# Altium footprint library TarabusLib_KAP.PcbLib: 504 footprints (part 15 of 32)
Each footprint in its own frame and in the unit in brackets; x right, y up, seen from the top. Pads: shape width x height; smd on the part's side, far side on the other; paste and mask are expansions set on the pad; w line width, h text height; cw(c..) or ccw(c..) is an arc to the next point about the centre after c.
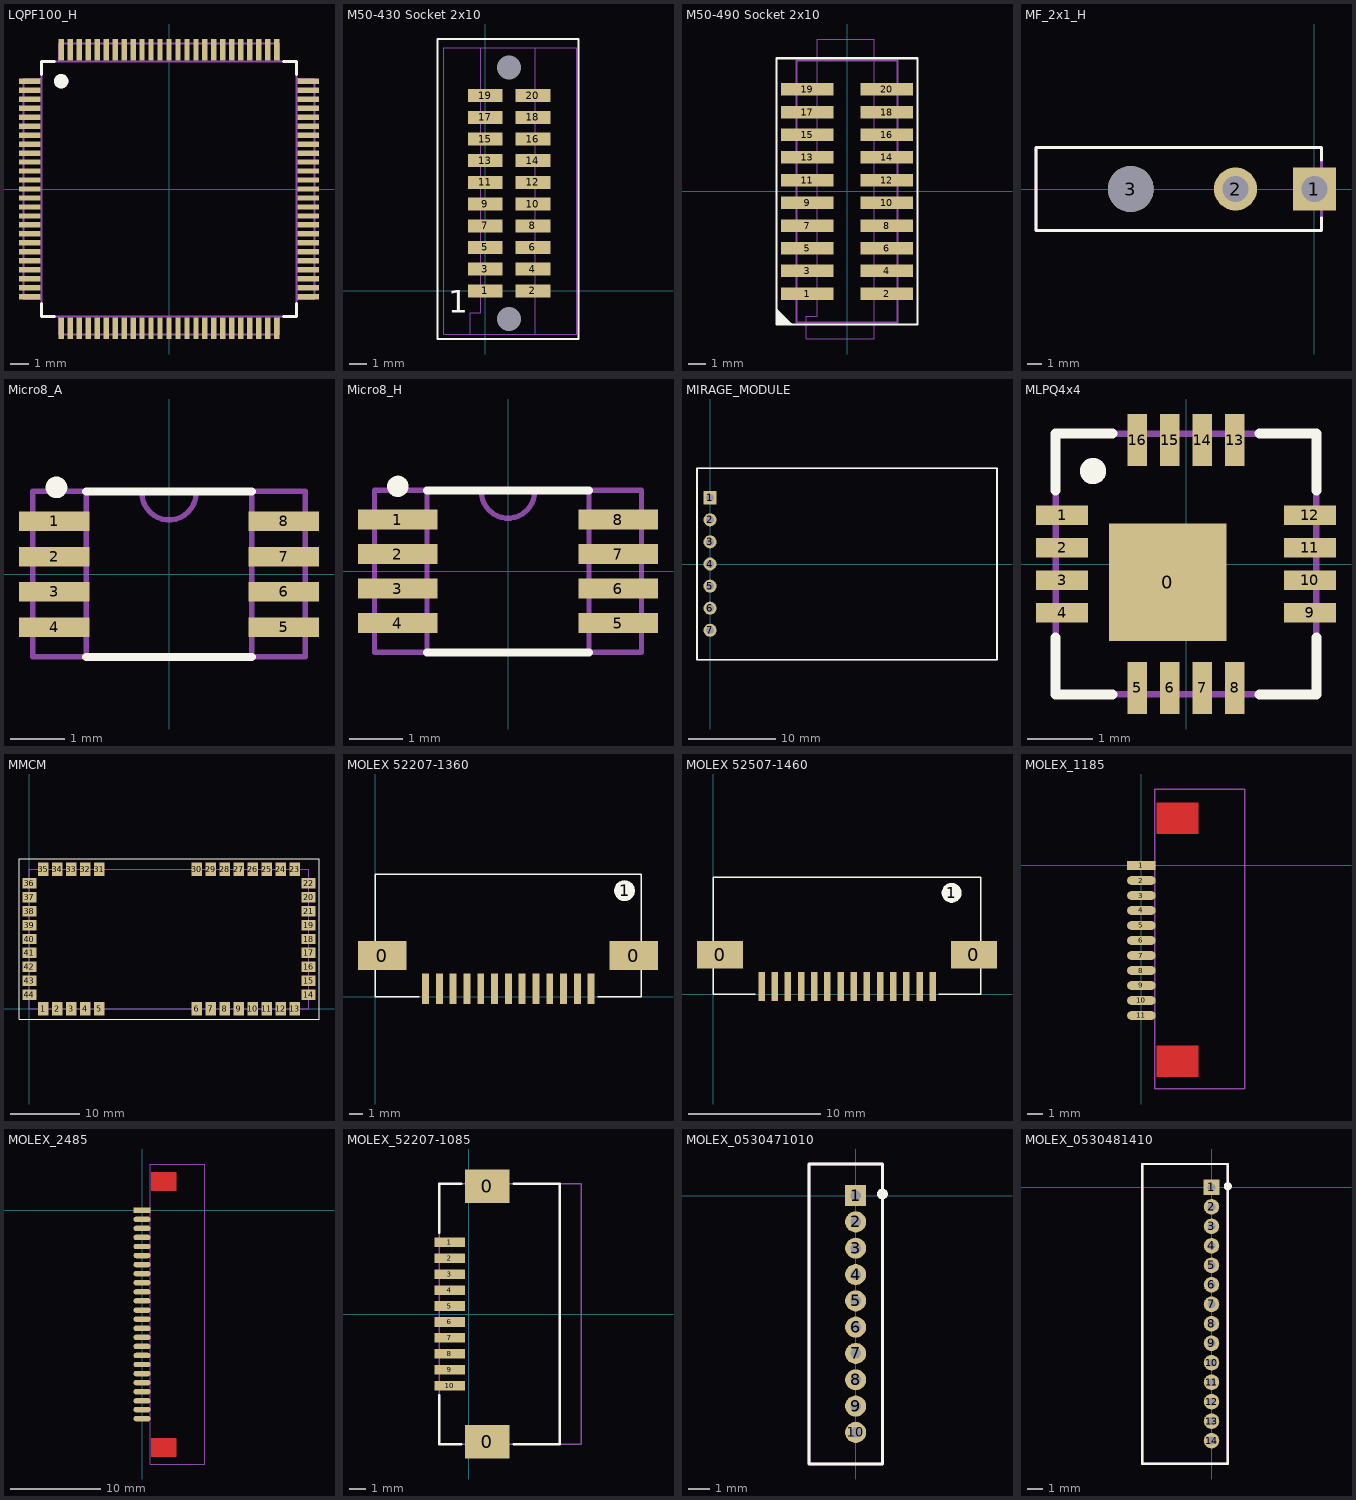
[diagram p14: the footprints below, top view; thin cyan lines are the x and y axes]

## LQPF100_H [mm]
height 1.6
pads (100):
  rect 1.2x0.3 smd: 1(-7.75,6) 2(-7.75,5.5) 3(-7.75,5) 4(-7.75,4.5) 5(-7.75,4) 6(-7.75,3.5) 7(-7.75,3) 8(-7.75,2.5) 9(-7.75,2) 10(-7.75,1.5) 11(-7.75,1) 12(-7.75,0.5) 13(-7.75,0) 14(-7.75,-0.5) 15(-7.75,-1) 16(-7.75,-1.5) 17(-7.75,-2) 18(-7.75,-2.5) 19(-7.75,-3) 20(-7.75,-3.5) 21(-7.75,-4) 22(-7.75,-4.5) 23(-7.75,-5) 24(-7.75,-5.5) 25(-7.75,-6) 51(7.75,-6) 52(7.75,-5.5) 53(7.75,-5) 54(7.75,-4.5) 55(7.75,-4) 56(7.75,-3.5) 57(7.75,-3) 58(7.75,-2.5) 59(7.75,-2) 60(7.75,-1.5) 61(7.75,-1) 62(7.75,-0.5) 63(7.75,0) 64(7.75,0.5) 65(7.75,1) 66(7.75,1.5) 67(7.75,2) 68(7.75,2.5) 69(7.75,3) 70(7.75,3.5) 71(7.75,4) 72(7.75,4.5) 73(7.75,5) 74(7.75,5.5) 75(7.75,6)
  rect 0.3x1.2 smd: 26(-6,-7.75) 27(-5.5,-7.75) 28(-5,-7.75) 29(-4.5,-7.75) 30(-4,-7.75) 31(-3.5,-7.75) 32(-3,-7.75) 33(-2.5,-7.75) 34(-2,-7.75) 35(-1.5,-7.75) 36(-1,-7.75) 37(-0.5,-7.75) 38(0,-7.75) 39(0.5,-7.75) 40(1,-7.75) 41(1.5,-7.75) 42(2,-7.75) 43(2.5,-7.75) 44(3,-7.75) 45(3.5,-7.75) 46(4,-7.75) 47(4.5,-7.75) 48(5,-7.75) 49(5.5,-7.75) 50(6,-7.75) 76(6,7.75) 77(5.5,7.75) 78(5,7.75) 79(4.5,7.75) 80(4,7.75) 81(3.5,7.75) 82(3,7.75) 83(2.5,7.75) 84(2,7.75) 85(1.5,7.75) 86(1,7.75) 87(0.5,7.75) 88(0,7.75) 89(-0.5,7.75) 90(-1,7.75) 91(-1.5,7.75) 92(-2,7.75) 93(-2.5,7.75) 94(-3,7.75) 95(-3.5,7.75) 96(-4,7.75) 97(-4.5,7.75) 98(-5,7.75) 99(-5.5,7.75) 100(-6,7.75)
Top Overlay:
  circle w0.4: c-6,6 r0.2
  lines w0.15: -7.1,-6.375 -7.1,-7.1 -6.375,-7.1 ; -7.1,6.375 -7.1,7.1 -6.375,7.1 ; 6.375,-7.1 7.1,-7.1 7.1,-6.375 ; 6.375,7.1 7.1,7.1 7.1,6.375
Mechanical 7:
  circle w0.4: c-6,6 r0.2
  lines w0.1: -7.1,-6.135 -8.1,-6.135 -8.1,6.135 -7.1,6.135 ; -6.135,-7.1 -6.135,-8.1 6.135,-8.1 6.135,-7.1 ; -6.135,7.1 -6.135,8.1 6.135,8.1 6.135,7.1 ; 7.1,-6.135 8.1,-6.135 8.1,6.135 7.1,6.135 ; -7.1,-7.1 -7.1,7.1 7.1,7.1 7.1,-7.1 -7.1,-7.1
Mechanical 10:
  text ".Comment" at -1.08,-0.495 h0.6
  text ".Designator" at -1.2,0.155 h0.8
3D body: height 1.6, standoff 0, extent -7.1,-7.1 7.1,7.1
3D body: height 0.9, standoff 0, extent -6.135,7.1 6.135,8.1
3D body: height 0.9, standoff 0, extent -8.1,-6.135 -7.1,6.135
3D body: height 0.9, standoff 0, extent 7.1,-6.135 8.1,6.135
3D body: height 0.9, standoff 0, extent -6.135,-8.1 6.135,-7.1

## M50-430 Socket 2x10 [mil]
height 240.16
pads (22):
  rect 80x30 smd paste-2 mask+4: 1(0,0) 2(110,0) 3(0,50) 4(110,50) 5(0,100) 6(110,100) 7(0,150) 8(110,150) 9(0,200) 10(110,200) 11(0,250) 12(110,250) 13(0,300) 14(110,300) 15(0,350) 16(110,350) 17(0,400) 18(110,400) 19(0,450) 20(110,450)
  round 5 / inner round 0 / far side round 5 hole 55 paste+0 mask+55: 21(55,-65) 22(54.96,515)
Top Overlay:
  lines w5: -110,-111 215,-111 215,580.51 -110,580.51 -110,-111
  text "1" at -85,-50 h52.5
Mechanical 1:
  lines w2: -35,-100 -35,-50 -10,-50 -10,560.83 115,560.83 115,-100 -35,-100
Mechanical 2:
  lines w0.1: -95.5,-100 210.5,-100 210.5,560.83 -95.5,560.83 -95.5,-100

## M50-490 Socket 2x10 [mm]
height 6.1
pads (20):
  rect 2.95x0.7 smd paste-0.051 mask+0.102: 1(-2.222,-5.715) 2(2.222,-5.715) 3(-2.222,-4.445) 4(2.222,-4.445) 5(-2.222,-3.175) 6(2.222,-3.175) 7(-2.222,-1.905) 8(2.222,-1.905) 9(-2.222,-0.635) 10(2.222,-0.635) 11(-2.222,0.635) 12(2.222,0.635) 13(-2.222,1.905) 14(2.222,1.905) 15(-2.222,3.175) 16(2.222,3.175) 17(-2.222,4.445) 18(2.222,4.445) 19(-2.222,5.715) 20(2.222,5.715)
Top Overlay:
  lines w0.127: -3.95,-7.237 -3.744,-7.444 ; -3.95,7.425 -3.95,-7.45 3.95,-7.45 3.95,7.425 ; -3.95,7.45 3.95,7.45 ; -3.937,-7.087 -3.612,-7.412 ; -3.937,-6.937 -3.437,-7.437 ; -3.937,-6.762 -3.3,-7.4 ; -3.937,-6.612 -3.119,-7.431
Mechanical 1:
  lines w0.051: -2.286,-8.255 1.524,-8.255 1.524,8.53 -1.651,8.53 -1.651,-6.985 -2.286,-6.985 -2.286,-8.255
Mechanical 7:
  lines w0.1: -2.825,-7.325 2.825,-7.325 2.825,7.325 -2.825,7.325 -2.825,-7.325
Mechanical 9:
  lines w0.1: -2.825,-7.325 -2.825,7.325 2.825,7.325 2.825,-7.325 -2.825,-7.325

## MF_2x1_H [mm]
pads (3):
  rect 3x3 hole 1.8 mask+0: 1(0,0)
  round 3 hole 1.8 mask+0: 2(-5.5,0)
  round 3.2 hole 3.2 mask+0: 3(-12.8,0)
Top Overlay:
  lines w0.2: 0.5,-2 0.5,-2.9 -19.4,-2.9 -19.4,2.9 0.5,2.9 0.5,2
Mechanical 7:
  lines w0.2: -19.4,-2.9 0.5,-2.9 0.5,2.9 -19.4,2.9 -19.4,-2.9
Mechanical 10:
  text ".Designator" at -2.67,3.04 h0.8
  text ".Comment" at -2,-3.6 h0.6
3D body "026013101.stp": height 11.4, standoff -3.6, extent -19.435,-2.9 0.5,2.9

## Micro8_A [mm]
height 1.11
pads (8):
  rect 1.3x0.36 smd: 1(-2.115,0.975) 2(-2.115,0.325) 3(-2.115,-0.325) 4(-2.115,-0.975) 5(2.115,-0.975) 6(2.115,-0.325) 7(2.115,0.325) 8(2.115,0.975)
Top Overlay:
  circle w0.2: c-2.075,1.6 r0.1
  lines w0.15: -1.525,-1.525 1.525,-1.525 ; -1.525,1.525 1.525,1.525
Mechanical 7:
  lines w0.1: -1.525,-1.525 -1.525,1.525 ; -0.499,1.525 ccw(c0,1.5) 0.499,1.525 ; 1.525,-1.525 1.525,1.525 ; -2.515,-1.525 -2.515,1.525 2.515,1.525 2.515,-1.525 -2.515,-1.525
Mechanical 10:
  text ".Comment" at -0.67,-2.26 h0.6
  text ".Designator" at -0.67,2.04 h0.8
3D body: height 0.7, standoff 0, extent -2.515,-1.525 -1.525,1.525
3D body: height 0.7, standoff 0, extent 1.525,-1.525 2.515,1.525
3D body: height 1.11, standoff 0, extent -1.525,-1.525 1.525,1.525

## Micro8_H [mm]
height 1.11
pads (8):
  rect 1.5x0.38 smd: 1(-2.075,0.975) 2(-2.075,0.325) 3(-2.075,-0.325) 4(-2.075,-0.975) 5(2.075,-0.975) 6(2.075,-0.325) 7(2.075,0.325) 8(2.075,0.975)
Top Overlay:
  circle w0.2: c-2.075,1.6 r0.1
  lines w0.15: -1.525,-1.525 1.525,-1.525 ; -1.525,1.525 1.525,1.525
Mechanical 7:
  lines w0.1: -1.525,-1.525 -1.525,1.525 ; -0.499,1.525 ccw(c0,1.5) 0.499,1.525 ; 1.525,-1.525 1.525,1.525 ; -2.515,-1.525 2.515,-1.525 2.515,1.525 -2.515,1.525 -2.515,-1.525
Mechanical 10:
  text ".Designator" at -0.67,2.04 h0.8
  text ".Comment" at -0.67,-2.26 h0.6
3D body: height 1.11, standoff 0, extent -1.525,-1.525 1.525,1.525
3D body: height 0.7, standoff 0, extent 1.525,-1.525 2.515,1.525
3D body: height 0.7, standoff 0, extent -2.515,-1.525 -1.525,1.525

## MIRAGE_MODULE [mm]
pads (7):
  rect 1.5x1.5 hole 0.9: 1(0,7.62)
  round 1.5 hole 0.9: 2(0,5.08) 3(0,2.54) 4(0,0) 5(0,-2.54) 6(0,-5.08) 7(0,-7.62)
Top Overlay:
  lines w0.2: -1.5,-11 33,-11 33,11 -1.5,11 -1.5,-11
Mechanical 7:
  lines w0.2: -1.5,-11 -1.5,11 33,11 33,-11 -1.5,-11
3D body: height 7, standoff 3, extent 2,-11 33,11
3D body: height 3, standoff 0, extent -1.5,-11 2,11
3D body: height 4, standoff 3, extent -1.5,-11 2,11
3D body: height 5, standoff -3, extent -0.3,7.3 0.3,7.9
3D body: height 5, standoff -3, extent -0.3,4.78 0.3,5.38
3D body: height 5, standoff -3, extent -0.3,2.22 0.3,2.82
3D body: height 5, standoff -3, extent -0.3,-0.32 0.3,0.28
3D body: height 5, standoff -3, extent -0.3,-2.86 0.3,-2.26
3D body: height 5, standoff -3, extent -0.3,-5.4 0.3,-4.8
3D body: height 5, standoff -3, extent -0.3,-7.94 0.3,-7.34

## MLPQ4x4 [mm]
height 1
pads (17):
  rect 1.8x1.8 smd: 0(-0.28,-0.28)
  rect 0.8x0.3 smd: 1(-1.9,0.75) 2(-1.9,0.25) 3(-1.9,-0.25) 4(-1.9,-0.75) 9(1.9,-0.75) 10(1.9,-0.25) 11(1.9,0.25) 12(1.9,0.75)
  rect 0.3x0.8 smd: 5(-0.75,-1.9) 6(-0.25,-1.9) 7(0.25,-1.9) 8(0.75,-1.9) 13(0.75,1.9) 14(0.25,1.9) 15(-0.25,1.9) 16(-0.75,1.9)
Top Overlay:
  circle w0.2: c-1.425,1.425 r0.1
  lines w0.15: -2,-1.125 -2,-2 -1.125,-2 ; -2,1.125 -2,2 -1.125,2 ; 1.125,-2 2,-2 2,-1.125 ; 1.125,2 2,2 2,1.125
Mechanical 7:
  circle w0.2: c-1.425,1.425 r0.1
  lines w0.1: -2,-2 2,-2 2,2 -2,2 -2,-2
Mechanical 10:
  text ".Designator" at -1.05,3.425 h0.8
  text ".Comment" at -0.65,2.775 h0.6
3D body: height 1, standoff 0, extent -2,-2 2,2

## MMCM [mm]
height 4
pads (44):
  rect 1.5x2 smd mask+0.075: 1(2,0) 2(4,0) 3(6,0) 4(8,0) 5(10,0) 6(24,0) 7(26,0) 8(28,0) 9(30,0) 10(32,0) 11(34,0) 12(36,0) 13(38,0) 23(38,20) 24(36,20) 25(34,20) 26(32,20) 27(30,20) 28(28,20) 29(26,20) 30(24,20) 31(10,20) 32(8,20) 33(6,20) 34(4,20) 35(2,20)
  rect 2x1.5 smd mask+0.075: 14(40,2) 15(40,4) 16(40,6) 17(40,8) 18(40,10) 19(40,12) 20(40,16) 21(40,14) 22(40,18) 36(0,18) 37(0,16) 38(0,14) 39(0,12) 40(0,10) 41(0,8) 42(0,6) 43(0,4) 44(0,2)
Top Overlay:
  lines w0.1: -1.5,-1.5 41.5,-1.5 41.5,21.5 -1.5,21.5 -1.5,-1.5
Mechanical 7:
  lines w0.1: 0,0 0,20 40,20 40,0 0,0
Mechanical 10:
  text ".Comment" at 18.373,13 h1
  text ".Designator" at 18.373,10 h1
3D body "MMCM_V1.step": height 4.6, standoff 0.32, extent 0,0 40,20

## MOLEX 52207-1360 [mm] "FFC/FCP Connector"
height 2.7
pads (16):
  rect 3.5x2.1 smd: 0(0.5,3) 0(18.75,3)
  rect 0.5x2.2 smd: 1(15.65,0.6) 2(14.65,0.6) 3(13.65,0.6) 4(12.65,0.6) 5(11.65,0.6) 6(10.65,0.6) 7(9.65,0.6) 8(8.65,0.6) 9(7.65,0.6) 10(6.65,0.6) 11(5.65,0.6) 12(4.65,0.6) 13(3.65,0.6)
  round 1.524 on Top Overlay: 1(18.075,7.7)
Top Overlay:
  lines w0.1: 3.175,0 0,0 0,8.9 19.3,8.9 19.3,0 16.125,0
3D body "522071360.stp": height 2.7, standoff 0, extent 0,0 19.3,8.9

## MOLEX 52507-1460 [mm] "FFC/FCP Connector"
height 2.7
pads (17):
  rect 3.5x2.1 smd: 0(0.5,3) 0(19.775,3)
  rect 0.5x2.2 smd: 1(16.65,0.6) 2(15.65,0.6) 3(14.65,0.6) 4(13.65,0.6) 5(12.65,0.6) 6(11.65,0.6) 7(10.65,0.6) 8(9.65,0.6) 9(8.65,0.6) 10(7.65,0.6) 11(6.65,0.6) 12(5.65,0.6) 13(4.65,0.6) 14(3.65,0.6)
  round 1.524 on Top Overlay: 1(18.075,7.7)
Top Overlay:
  lines w0.1: 3.175,0 0,0 0,8.9 20.275,8.9 20.275,0 17.1,0
3D body "522071460.stp": height 2.7, standoff 0, extent -0.05,0.2 20.25,9.1

## MOLEX_1185 [mm]
pads (11):
  rect 1.9x0.6 smd: 1(0,0)
  oval 1.9x0.6 smd: 2(0,-1) 3(0,-2) 4(0,-3) 5(0,-4) 6(0,-5) 7(0,-6) 8(0,-7) 9(0,-8) 10(0,-9) 11(0,-10)
Top Layer:
  rectangle: 1,-14.108 3.8,-12.008
  rectangle: 1,2.1 3.8,4.2
Top Solder:
  rectangle: 0.9,-14.208 3.9,-11.908
  rectangle: 0.9,2 3.9,4.3
Mechanical 1:
  lines w0.1: 0.9,-14.9 6.9,-14.9 6.9,5.1 0.9,5.1 0.9,-14.9

## MOLEX_2485 [mm]
pads (24):
  rect 1.9x0.6 smd: 1(0,0)
  oval 1.9x0.6 smd: 2(0,-1) 3(0,-2) 4(0,-3) 5(0,-4) 6(0,-5) 7(0,-6) 8(0,-7) 9(0,-8) 10(0,-9) 11(0,-10) 12(0,-11.025) 13(0,-12.025) 14(0,-13.025) 15(0,-14.025) 16(0,-15.025) 17(0,-16.025) 18(0,-17.025) 19(0,-18.025) 20(0,-19.025) 21(0,-20.025) 22(0,-21.025) 23(0,-22) 24(0,-23)
Top Layer:
  rectangle: 1,2.1 3.8,4.2
  rectangle: 1,-27.208 3.8,-25.108
Top Solder:
  rectangle: 0.9,2 3.9,4.3
  rectangle: 0.9,-27.308 3.9,-25.008
Mechanical 1:
  lines w0.1: 0.9,-28 0.9,5.1 6.9,5.1 6.9,-28 0.9,-28

## MOLEX_52207-1085 [mm]
height 2.7
pads (12):
  rect 2.8x2.1 smd: 0(1.175,-8) 0(1.175,8)
  rect 1.9x0.6 smd: 1(-1.175,4.5) 2(-1.175,3.5) 3(-1.175,2.5) 4(-1.175,1.5) 5(-1.175,0.5) 6(-1.175,-0.5) 7(-1.175,-1.5) 8(-1.175,-2.5) 9(-1.175,-3.5) 10(-1.175,-4.5)
Top Overlay:
  lines w0.15: -1.825,-5.075 -1.825,-8.15 -0.45,-8.15 ; -1.825,5.075 -1.825,8.15 -0.45,8.15 ; 2.825,-8.15 5.725,-8.15 5.725,8.15 2.825,8.15
Mechanical 7:
  lines w0.1: -1.825,-8.15 -1.825,8.15 7.075,8.15 7.075,-8.15 -1.825,-8.15
Mechanical 10:
  text ".Designator" at 0.795,10.18 h0.8
  text ".Comment" at 0.805,9.61 h0.6
3D body "522071085.STEP": height 2.69, standoff -0.01, extent -1.825,-8.15 7.075,8.15

## MOLEX_0530471010 [mm]
pads (10):
  rect 1x1 hole 0.5 mask+0.15: 1(0,0)
  round 1 hole 0.5 mask+0.15: 2(0,-1.25) 3(0,-2.5) 4(0,-3.75) 5(0,-5) 6(0,-6.25) 7(0,-7.5) 8(0,-8.75) 9(0,-10) 10(0,-11.25)
Top Overlay:
  circle w0.254: c1.273,0.075 r0.127
  lines w0.15: -2.225,-12.75 1.275,-12.75 1.275,1.5 -2.225,1.5 -2.225,-12.75
Mechanical 7:
  lines w0.15: -2.225,-12.75 1.275,-12.75 1.275,1.5 -2.225,1.5 -2.225,-12.75
3D body "User Library-53047-1010.step": height 4.25, standoff -2.25, extent -2.225,-12.75 1.275,1.5

## MOLEX_0530481410 [mm]
pads (14):
  rect 1x1 hole 0.5 mask+0.15: 1(0,0)
  round 1 hole 0.5 mask+0.15: 2(0,-1.25) 3(0,-2.5) 4(0,-3.75) 5(0,-5) 6(0,-6.25) 7(0,-7.5) 8(0,-8.75) 9(0,-10) 10(0,-11.25) 11(0,-12.5) 12(0,-13.75) 13(0,-15) 14(0,-16.25)
Top Overlay:
  circle w0.254: c1.048,0.075 r0.127
  lines w0.15: -4.45,-17.725 1.025,-17.725 1.05,-17.75 1.05,1.5 -4.45,1.5 -4.45,-17.725
Mechanical 7:
  lines w0.15: -4.45,-17.725 -4.45,1.5 1.05,1.5 1.05,-17.75 1.025,-17.725 -4.45,-17.725
3D body "User Library-53048-1410.step": height 3.5, standoff -2.4, extent -4.45,-17.75 1.05,1.5